# Altium footprint library Connector.PcbLib: 536 footprints (part 31 of 34)
Each footprint in its own frame and in the unit in brackets; x right, y up, seen from the top. Pads: shape width x height; smd on the part's side, far side on the other; paste and mask are expansions set on the pad; w line width, h text height; cw(c..) or ccw(c..) is an arc to the next point about the centre after c.
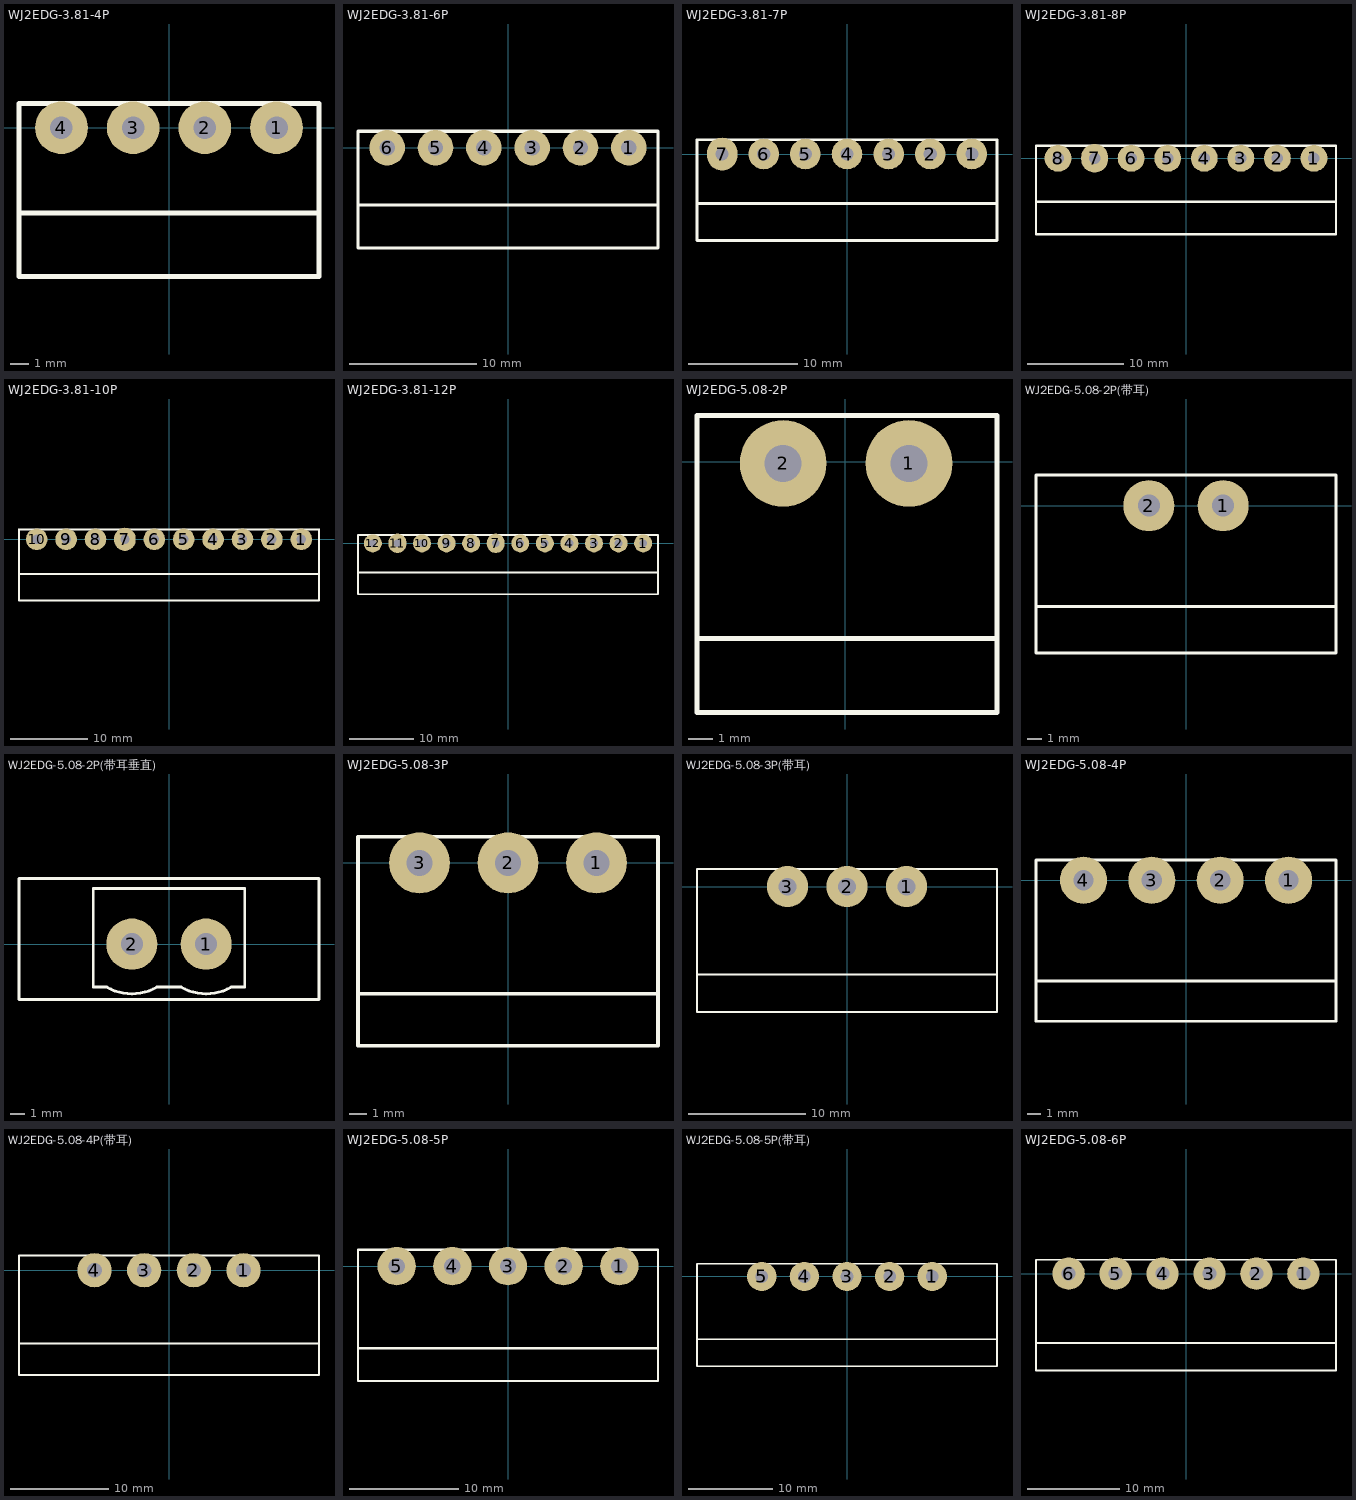
[diagram p30: the footprints below, top view; thin cyan lines are the x and y axes]

## WJ2EDG-3.81-4P [mm]
height 7
pads (4):
  round 2.8 hole 1.2: 1(5.715,0) 2(1.905,0) 3(-1.905,0) 4(-5.715,0)
Top Overlay:
  lines w0.254: -7.97,-4.521 7.97,-4.521 ; -7.97,-7.905 7.97,-7.905 7.97,1.295 -7.97,1.295 -7.97,-7.905
3D body "3.81mm-04 way.stp": height 7.1, standoff -3.17, extent -7.965,-7.905 7.965,1.295

## WJ2EDG-3.81-6P [mm]
height 7
pads (6):
  round 2.8 hole 1.2: 1(9.525,0) 2(5.715,0) 3(1.905,0) 4(-1.905,0) 5(-5.715,0) 6(-9.525,0)
Top Overlay:
  lines w0.254: -11.78,-4.521 11.825,-4.521 ; -11.825,1.295 11.825,1.295 ; -11.825,1.295 -11.825,1.295 ; -11.825,1.295 -11.825,-7.905 11.825,-7.905 11.825,1.295 ; 11.825,1.295 11.825,1.295
3D body "3.81mm-06 way.stp": height 7.25, standoff -3.4, extent -12.125,-8.005 12.125,1.295

## WJ2EDG-3.81-7P [mm]
height 7
pads (7):
  round 2.8 hole 1.2: 1(11.43,0) 2(7.62,0) 3(3.81,0) 4(0,0) 5(-3.81,0) 6(-7.62,0)
  oval 2.8x3 hole 1.2: 7(-11.43,0)
Top Overlay:
  lines w0.254: -13.73,-4.521 13.73,-4.521 ; -13.73,1.295 13.73,1.295 ; -13.73,1.295 -13.73,1.295 ; -13.73,1.295 -13.73,-7.905 13.73,-7.905 13.73,1.295 ; 13.73,1.295 13.73,1.295
3D body "3.81mm-07 way.stp": height 7.35, standoff -3.3, extent -14.03,-8.005 14.03,1.295

## WJ2EDG-3.81-8P [mm]
height 7
pads (8):
  round 2.8 hole 1.2: 1(13.335,0) 2(9.525,0) 3(5.715,0) 4(1.905,0) 5(-1.905,0) 6(-5.715,0) 8(-13.335,0)
  oval 2.8x3 hole 1.2: 7(-9.525,0)
Top Overlay:
  lines w0.254: -15.635,-4.521 15.635,-4.521 ; -15.635,1.295 -15.635,1.295 ; -15.635,1.295 -15.635,-7.905 15.635,-7.905 15.635,1.295 ; -15.635,1.295 15.635,1.295 ; 15.635,1.295 15.635,1.295
3D body "3.81mm-08 way.stp": height 7.25, standoff -3.4, extent -15.935,-8.005 15.935,1.295

## WJ2EDG-3.81-10P [mm]
height 7
pads (10):
  round 2.8 hole 1.2: 1(17.145,0) 2(13.335,0) 3(9.525,0) 4(5.715,0) 5(1.905,0) 6(-1.905,0) 8(-9.525,0) 9(-13.335,0) 10(-17.145,0)
  oval 2.8x3 hole 1.2: 7(-5.715,0)
Top Overlay:
  lines w0.254: -19.445,-7.905 -19.445,1.295 ; -19.431,-7.905 19.445,-7.905 19.445,1.295 ; -19.431,-4.521 19.445,-4.521 ; -19.431,1.295 19.445,1.295 ; -19.445,1.295 -19.445,1.295 ; 19.445,1.295 19.445,1.295
3D body "3.81mm-12 way.stp": height 7.25, standoff -3.4, extent -19.745,-8.005 19.745,1.295

## WJ2EDG-3.81-12P [mm]
height 7
pads (12):
  round 2.8 hole 1.2: 1(20.955,0) 2(17.145,0) 3(13.335,0) 4(9.525,0) 5(5.715,0) 6(1.905,0) 8(-5.715,0) 9(-9.525,0) 10(-13.335,0) 12(-20.955,0)
  oval 2.8x3 hole 1.2: 7(-1.905,0) 11(-17.145,0)
Top Overlay:
  lines w0.254: -23.255,-4.521 23.255,-4.521 ; 23.255,1.295 23.255,1.295 ; 23.255,1.295 23.255,-7.905 -23.255,-7.905 -23.255,1.295 23.255,1.295
3D body "3.81mm-12 way.stp": height 7.3, standoff -3.35, extent -23.555,-8.005 23.555,1.295

## WJ2EDG-5.08-2P [mm]
height 8.2
pads (2):
  round 3.5 hole 1.5: 1(2.565,-0.076) 2(-2.515,-0.076)
Top Overlay:
  lines w0.203: -5.918,-7.144 6.121,-7.144 ; -5.994,-10.135 6.121,-10.135 6.121,1.856 -5.994,1.856 -5.994,-10.135
3D body "User Library-TB5_08-2R.step": height 8.95, standoff -3.7, extent -6.062,-10.144 6.098,1.856

## WJ2EDG-5.08-2P(带耳) [mm]
height 8.2
pads (2):
  round 3.5 hole 1.5: 1(2.54,0) 2(-2.54,0)
Top Overlay:
  lines w0.203: -10.26,-6.89 10.26,-6.89 ; 10.26,-10.09 -10.26,-10.09 -10.26,2.11 10.26,2.11 10.26,-10.084
3D body "5.08mm-02 way.stp": height 8.63, standoff -3.47, extent -10.16,-9.996 10.16,2.007

## WJ2EDG-5.08-2P(带耳垂直) [mm]
height 8.2
pads (2):
  round 3.5 hole 1.5: 1(2.54,0) 2(-2.54,0)
Top Overlay:
  lines w0.203: -10.26,-3.8 10.26,-3.8 10.26,4.5 -10.26,4.5 -10.26,-3.8 ; -5.182,-2.948 -5.182,3.81 5.182,3.81 5.182,-2.948 4.242,-2.948 cw(c2.54,0) 0.838,-2.948 -0.838,-2.948 cw(c-2.54,0) -4.242,-2.948 -5.182,-2.948
3D body: height 12, standoff 0, extent -10.26,-3.8 10.26,4.5

## WJ2EDG-5.08-3P [mm]
height 8.2
pads (3):
  round 3.5 hole 1.5: 1(5.08,0) 2(0,0) 3(-5.08,0)
Top Overlay:
  lines w0.203: -8.611,-7.5 8.611,-7.5 ; -8.611,-10.49 8.611,-10.49 8.611,1.5 -8.611,1.5 -8.611,-10.49
3D body "5.08mm-03 way.stp": height 8.6, standoff -3.5, extent -8.629,-10.502 8.611,1.5

## WJ2EDG-5.08-3P(带耳) [mm]
height 8.2
pads (3):
  round 3.5 hole 1.5: 1(5.08,0) 2(0,0) 3(-5.08,0)
Top Overlay:
  lines w0.203: -12.8,-7.5 12.8,-7.5 ; 12.8,-10.7 -12.8,-10.7 -12.8,1.5 12.8,1.5 12.8,-10.693
3D body: height 8.4, standoff 0, extent -12.803,-10.7 12.8,1.5

## WJ2EDG-5.08-4P [mm]
height 8.2
pads (4):
  round 3.5 hole 1.5: 1(7.62,0) 2(2.54,0) 3(-2.54,0) 4(-7.62,0)
Top Overlay:
  lines w0.203: -11.151,-7.5 11.151,-7.5 ; -11.151,-10.49 11.151,-10.49 11.151,1.5 -11.151,1.5 -11.151,-10.49
3D body "5.08mm-04 way.stp": height 8.6, standoff -3.5, extent -11.169,-10.502 11.151,1.5

## WJ2EDG-5.08-4P(带耳) [mm]
height 8.2
pads (4):
  round 3.5 hole 1.5: 1(7.62,0) 2(2.54,0) 3(-2.54,0) 4(-7.62,0)
Top Overlay:
  lines w0.203: -15.34,-7.5 15.34,-7.5 ; 15.34,-10.7 -15.34,-10.7 -15.34,1.5 15.34,1.5 15.34,-10.693
3D body: height 8.4, standoff 0, extent -15.34,-10.7 15.34,1.5

## WJ2EDG-5.08-5P [mm]
height 8.2
pads (5):
  round 3.5 hole 1.5: 1(10.16,0) 2(5.08,0) 3(0,0) 4(-5.08,0) 5(-10.16,0)
Top Overlay:
  lines w0.203: -13.691,-7.5 13.691,-7.5 ; -13.691,-10.49 13.691,-10.49 13.691,1.5 -13.691,1.5 -13.691,-10.49
3D body "5.08mm-03 way.stp": height 8.6, standoff -3.5, extent -13.69,-10.5 3.55,1.502
3D body "5.08mm-03 way.stp": height 8.6, standoff -3.5, extent -3.549,-10.502 13.691,1.5

## WJ2EDG-5.08-5P(带耳) [mm]
height 8.2
pads (5):
  round 3.5 hole 1.5: 1(10.16,0) 2(5.08,0) 3(0,0) 4(-5.08,0) 5(-10.16,0)
Top Overlay:
  lines w0.203: -17.88,-10.7 17.88,-10.7 ; -17.88,-10.693 -17.88,1.5 17.88,1.5 17.88,-10.693 ; -17.88,-7.5 17.88,-7.5
3D body: height 8.4, standoff 0, extent -17.88,-10.7 17.88,1.5

## WJ2EDG-5.08-6P [mm]
height 8.2
pads (6):
  round 3.5 hole 1.5: 1(12.7,0) 2(7.62,0) 3(2.54,0) 4(-2.54,0) 5(-7.62,0) 6(-12.7,0)
Top Overlay:
  lines w0.203: -16.231,-7.5 16.231,-7.5 ; -16.231,-10.49 16.231,-10.49 16.231,1.5 -16.231,1.5 -16.231,-10.49
3D body "5.08mm-06 way.stp": height 8.6, standoff -3.5, extent -16.23,-10.5 16.25,1.502